# Altium footprint library BARKO_PCBLIB.PcbLib: 531 footprints (part 21 of 34)
Each footprint in its own frame and in the unit in brackets; x right, y up, seen from the top. Pads: shape width x height; smd on the part's side, far side on the other; paste and mask are expansions set on the pad; w line width, h text height; cw(c..) or ccw(c..) is an arc to the next point about the centre after c.
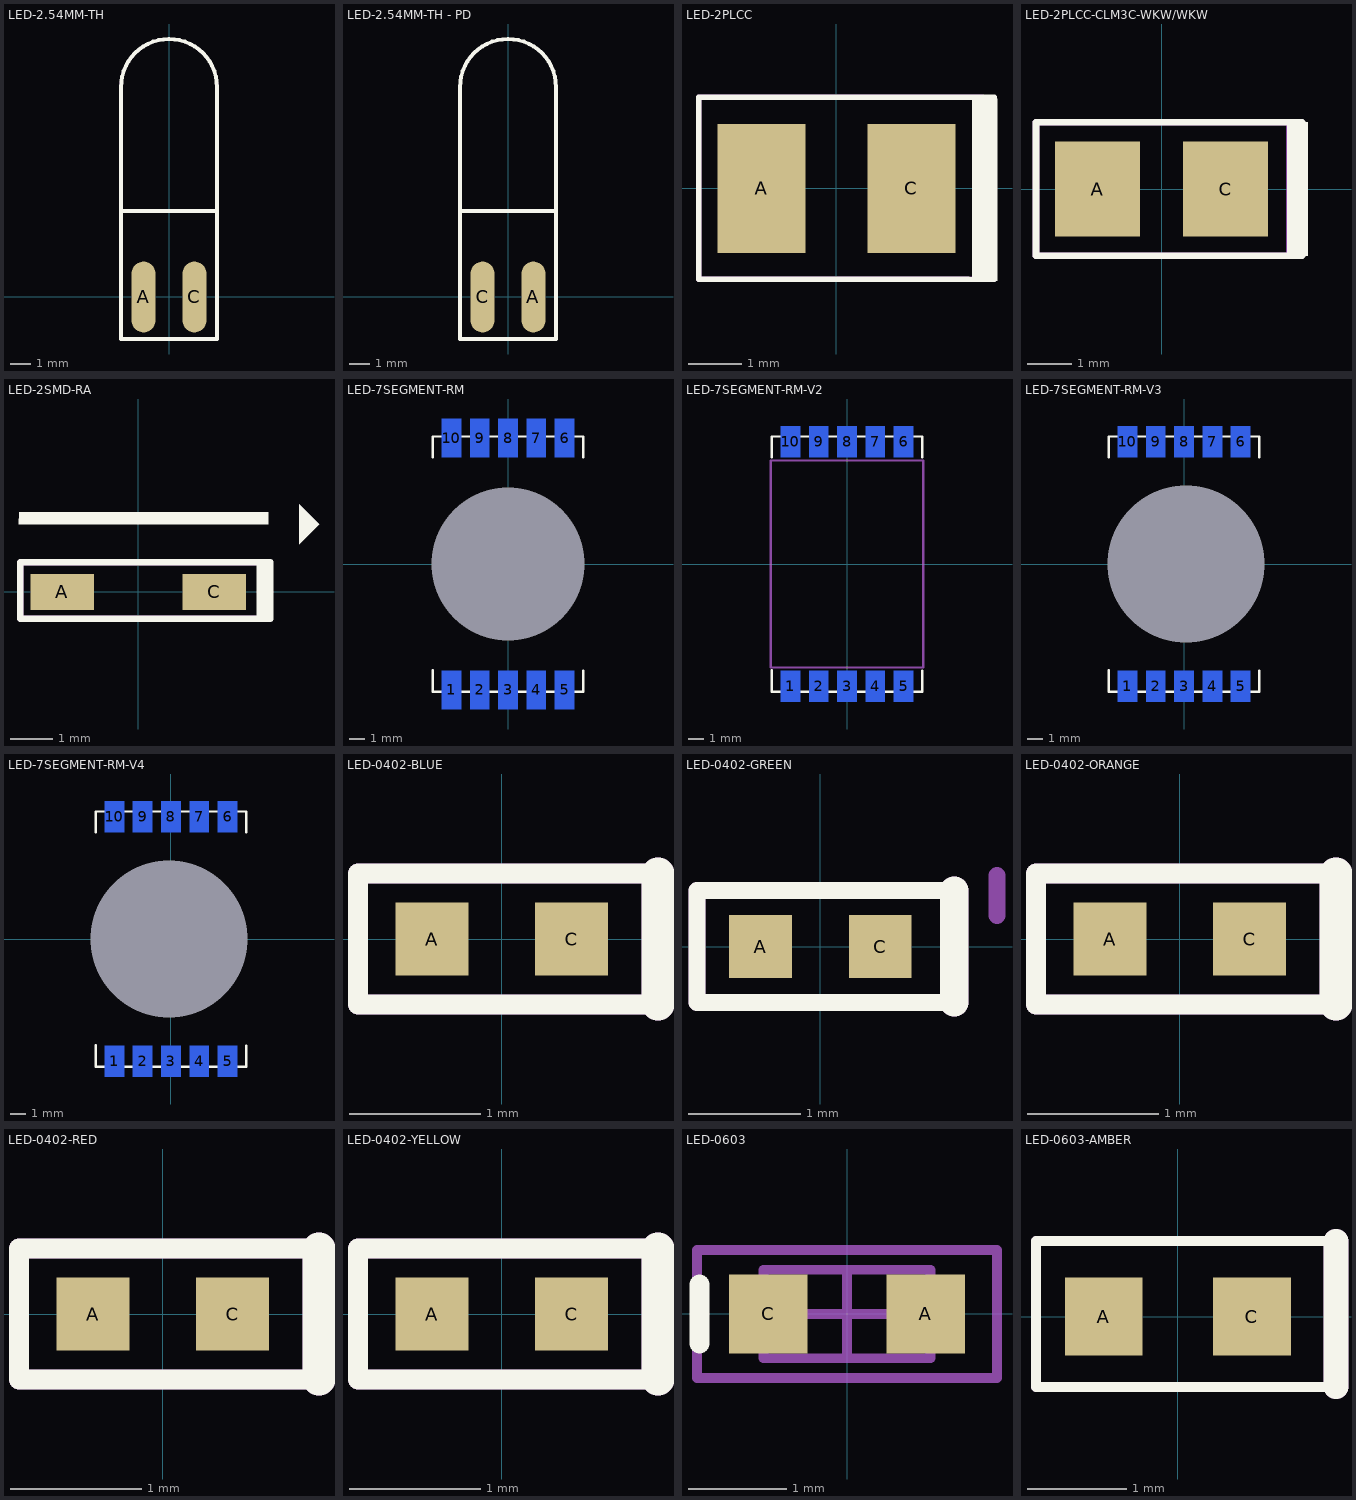
[diagram p20: the footprints below, top view; thin cyan lines are the x and y axes]

## LED-2.54MM-TH [mm]
pads (2):
  oval 1.2x3.54 smd mask+0.05: A(-1.27,0) C(1.27,0)
Top Overlay:
  lines w0.2: -2.4,4.25 -2.4,10.5 cw(c0,10.5) 2.4,10.5 2.4,4.3 -2.4,4.3 -2.4,4.2 -2.4,-2.1 2.4,-2.1 2.4,4.2
ASM Top:
  lines w0.15: -2.403,10.487 cw(c0,10.487) 2.4,10.599 2.4,-2.1 -2.388,-2.1 -2.388,10.487
3D body "User Library-LED5MM.step": height 5.95, standoff 0.05, extent -2.951,-2.6 2.951,13

## LED-2.54MM-TH - PD [mm]
pads (2):
  oval 1.2x3.54 smd mask+0.05: A(1.27,0) C(-1.27,0)
Top Overlay:
  lines w0.2: -2.4,4.25 -2.4,10.5 cw(c0,10.5) 2.4,10.5 2.4,4.3 -2.4,4.3 -2.4,4.2 -2.4,-2.1 2.4,-2.1 2.4,4.2
3D body "User Library-LED5MM.step": height 5.95, standoff 0.05, extent -2.951,-2.6 2.951,13

## LED-2PLCC [mm]
pads (2):
  rect 1.65x2.41 smd: A(-1.4,0) C(1.4,0)
Top Overlay:
  region: 2.537,1.676 2.537,-1.727 2.997,-1.727 2.997,1.676
  lines w0.1: 2.461,-1.702 2.946,-1.702 ; 2.461,1.702 2.946,1.702
  lines w0.102: 2.461,-1.702 -2.568,-1.702 -2.568,1.702 2.461,1.702
ASM Top:
  lines w0.102: -2.568,-1.702 2.461,-1.702 2.718,-1.702 2.718,-0.708 2.718,1.013 2.718,1.702 2.461,1.702 -2.568,1.702 -2.568,-1.702
  text ".designator" at -2.187,-1.168 h0.8
3D body: height 0.25, standoff 0, extent -0.13,0.876 -0.13,0.876
3D body "2plcc.STEP": height 2.11, standoff 0.01, extent -1.832,-1.5 1.928,1.5

## LED-2PLCC-CLM3C-WKW/WKW [mil]
pads (2):
  rect 75x84 smd: A(-56.5,0) C(56.5,0)
Top Overlay:
  region: 154,-1
  region: 148,56
  region: 129.22,-59 111,-59 111,59 129.22,59
  lines w6: 124,-59 -111,-59 -111,59 124,59
ASM Top:
  lines w6: -111,-59 -111,59 113,59 113,-59 -111,-59
  text ".designator" at -85,-28 h31.5
3D body "2PLCC-LED.STEP": height 73.73, standoff 0.5, extent -67,-55.23 70.79,55

## LED-2SMD-RA [mm]
pads (2):
  rect 1.5x0.85 smd: A(-1.8,0) C(1.8,0)
Top Overlay:
  region: 4.27,1.6 3.8,2.07 3.8,1.13
  region: 3.124,-0.635 2.794,-0.635 2.794,0.7 3.124,0.7
  region: -2.82,1.879 3.073,1.879 3.073,1.6 0.127,1.6 -2.82,1.6
  lines w0.152: -2.794,-0.635 3.124,-0.635 3.124,0.559 3.124,0.7 -2.794,0.7 -2.794,-0.635
ASM Top:
  region: 2.794,0.889
  lines w0.152: -2.794,-0.635 3,-0.635 3,-0.155 3,0.7 -2.794,0.7 -2.794,-0.635
  text ".designator" at -3.3,-2 h0.8
3D body "right angle led.STEP": height 0.61, standoff 0.01, extent -1.895,-0.483 1.905,0.517

## LED-7SEGMENT-RM [mil]
pads (11):
  rect 50x100 smd far side: 1(-146,-325) 2(-73,-325) 3(0,-325) 4(73,-325) 5(146,-325) 6(146,325) 7(73,325) 8(0,325) 9(-73,325) 10(-146,325)
  round 1 hole 394 square unplated: 4(0,0)
Top Overlay:
  lines w6: -194,-274 -194,-330 194,-330 194,-275 ; -194,275 -194,329 194,329 194,275
Bottom Overlay:
  lines w6: -194,-338 -194,-387 194,-387 194,-338 ; -194,338 -194,387 194,387 194,338 ; -194,-267 -194,267 194,267 194,-267 -194,-267

## LED-7SEGMENT-RM-V2 [mil]
pads (10):
  rect 50x80 smd far side: 1(-146,-315) 2(-73,-315) 3(0,-315) 4(73,-315) 5(146,-315) 6(146,315) 7(73,315) 8(0,315) 9(-73,315) 10(-146,315)
Top Overlay:
  lines w6: -194,-274 -194,-330 194,-330 194,-275 ; -194,275 -194,329 194,329 194,275
Bottom Overlay:
  lines w6: -194,-338 -194,-387 194,-387 194,-338 ; -194,338 -194,387 194,387 194,338 ; -194,-267 -194,267 194,267 194,-267 -194,-267
ASM Top:
  lines w6: -197,-267 -197,267 197,267 197,-267 -197,-267

## LED-7SEGMENT-RM-V3 [mil]
pads (11):
  rect 50x80 smd far side: 1(-146,-315) 2(-73,-315) 3(0,-315) 4(73,-315) 5(146,-315) 6(146,315) 7(73,315) 8(0,315) 9(-73,315) 10(-146,315)
  round 1 hole 404 square unplated: 4(5,0)
Top Overlay:
  lines w6: -194,-274 -194,-330 194,-330 194,-275 ; -194,275 -194,329 194,329 194,275
Bottom Overlay:
  lines w6: -194,-338 -194,-387 194,-387 194,-338 ; -194,338 -194,387 194,387 194,338 ; -194,-267 194,-267 194,267 -194,267 -194,-267

## LED-7SEGMENT-RM-V4 [mil]
pads (11):
  rect 50x80 smd far side: 1(-146,-315) 2(-73,-315) 3(0,-315) 4(73,-315) 5(146,-315) 6(146,315) 7(73,315) 8(0,315) 9(-73,315) 10(-146,315)
  round 1 hole 404 square unplated: 4(-5,0)
Top Overlay:
  lines w6: -194,-274 -194,-330 194,-330 194,-275 ; -194,275 -194,329 194,329 194,275
Bottom Overlay:
  lines w6: -194,-338 -194,-387 194,-387 194,-338 ; -194,338 -194,387 194,387 194,338 ; -194,-267 194,-267 194,267 -194,267 -194,-267

## LED-0402-BLUE [mil]
pads (2):
  rect 22x22 smd mask+2: A(-21,0)
  rect 22x22 smd paste+0 mask+2: C(21,0)
Top Overlay:
  lines w6: 47,-19.68 -43.31,-19.68 -43.31,19.68 47,19.68
  lines w9.84: 47,-19.68 47,19.68
ASM Top:
  lines w6: 47,-19.68 -43.31,-19.68 -43.31,19.68 47,19.68
  lines w9.84: 47,-19.68 47,19.68
  text ".designator" at -10,-5.64 h31.5
3D body "led_blue_0402.STEP": height 18.21, standoff 0.5, extent -20.87,-9.84 18.89,9.85

## LED-0402-GREEN [mil]
pads (2):
  rect 22x22 smd mask+2: A(-21,0) C(21,0)
Top Overlay:
  lines w6: 47,-19.68 -43.31,-19.68 -43.31,19.68 47,19.68
  lines w9.84: 47,-19.68 47,19.68
ASM Top:
  lines w6: 47,-19.68 -43.31,-19.68 -43.31,19.68 47,19.68 ; 62,11 62,25
  lines w9.84: 47,-19.68 47,19.68
  text ".designator" at -27,-6 h31.5
3D body "led_green_0402.STEP": height 18.21, standoff 0.5, extent -19.88,-9.84 19.89,9.85

## LED-0402-ORANGE [mil]
pads (2):
  rect 22x22 smd mask+2: A(-21,0) C(21,0)
Top Overlay:
  lines w6: 47,-19.68 -43.31,-19.68 -43.31,19.68 47,19.68
  lines w9.84: 47,-19.68 47,19.68
ASM Top:
  lines w6: 47,-19.68 -43.31,-19.68 -43.31,19.68 47,19.68
  lines w9.84: 47,-19.68 47,19.68
  text ".designator" at -27,-6 h31.5
3D body "led_orange_0402.STEP": height 18.21, standoff 0.5, extent -19.88,-9.84 19.89,9.85

## LED-0402-RED [mil]
pads (2):
  rect 22x22 smd mask+2: A(-21,0) C(21,0)
Top Overlay:
  lines w6: 47,-19.68 -43.31,-19.68 -43.31,19.68 47,19.68
  lines w9.84: 47,-19.68 47,19.68
ASM Top:
  lines w6: 47,-19.68 -43.31,-19.68 -43.31,19.68 47,19.68
  lines w9.84: 47,-19.68 47,19.68
  text ".designator" at -26,-6 h31.5
3D body "led_red_0402.STEP": height 18.21, standoff 0.5, extent -19.88,-9.84 19.89,9.85

## LED-0402-YELLOW [mil]
pads (2):
  rect 22x22 smd mask+2: A(-21,0) C(21,0)
Top Overlay:
  lines w6: 47,-19.68 -43.31,-19.68 -43.31,19.68 47,19.68
  lines w9.84: 47,-19.68 47,19.68
ASM Top:
  lines w6: 47,-19.68 -43.31,-19.68 -43.31,19.68 47,19.68
  lines w9.84: 47,-19.68 47,19.68
  text ".designator" at -27,-6 h31.5
3D body "led_yellow_0402.STEP": height 18.21, standoff 0.5, extent -19.88,-9.84 19.89,9.85

## LED-0603 [mm] "Chip LED, 2-Leads, Body 1.6x0.8mm, IPC Medium Density"
height 0.68
pads (2):
  rect 0.8x0.8 smd: A(0.8,0) C(-0.8,0)
Top Overlay:
  lines w0.2: -1.5,-0.3 -1.5,0.3
Mechanical 15:
  lines w0.1: -0.45,0 0.45,0 ; 0,-0.45 0,0.45 ; -1.525,-0.65 -1.525,0.65 1.525,0.65 1.525,-0.65 -1.525,-0.65
ASM Top:
  lines w0.1: -0.85,-0.45 -0.85,0.45 0.85,0.45 0.85,-0.45 -0.85,-0.45
  text ".designator" at -0.4,-0.4 h0.8
3D body "WL-SMCW_0603_LED.stp": height 0.7, standoff 0, extent -0.8,-0.4 0.8,0.4

## LED-0603-AMBER [mil]
pads (2):
  rect 31x31 smd: A(-29.5,0) C(29.5,0)
Top Overlay:
  lines w4: 62.99,-28 -56.5,-28 -56.5,30 62.99,30
  lines w9.84: 62.99,-28 62.99,30
ASM Top:
  lines w4: 62.99,-28 -56.5,-28 -56.5,30 62.99,30
  lines w9.84: 62.99,-28 62.99,30
  text ".designator" at -14,-6.57 h31.5
3D body "LED_0603_Y.STEP": height 23.62, standoff -0.08, extent -31.49,-15.74 31.5,15.75